# Altium footprint library CustomCase.PcbLib: 268 footprints (part 2 of 17)
Each footprint in its own frame and in the unit in brackets; x right, y up, seen from the top. Pads: shape width x height; smd on the part's side, far side on the other; paste and mask are expansions set on the pad; w line width, h text height; cw(c..) or ccw(c..) is an arc to the next point about the centre after c.
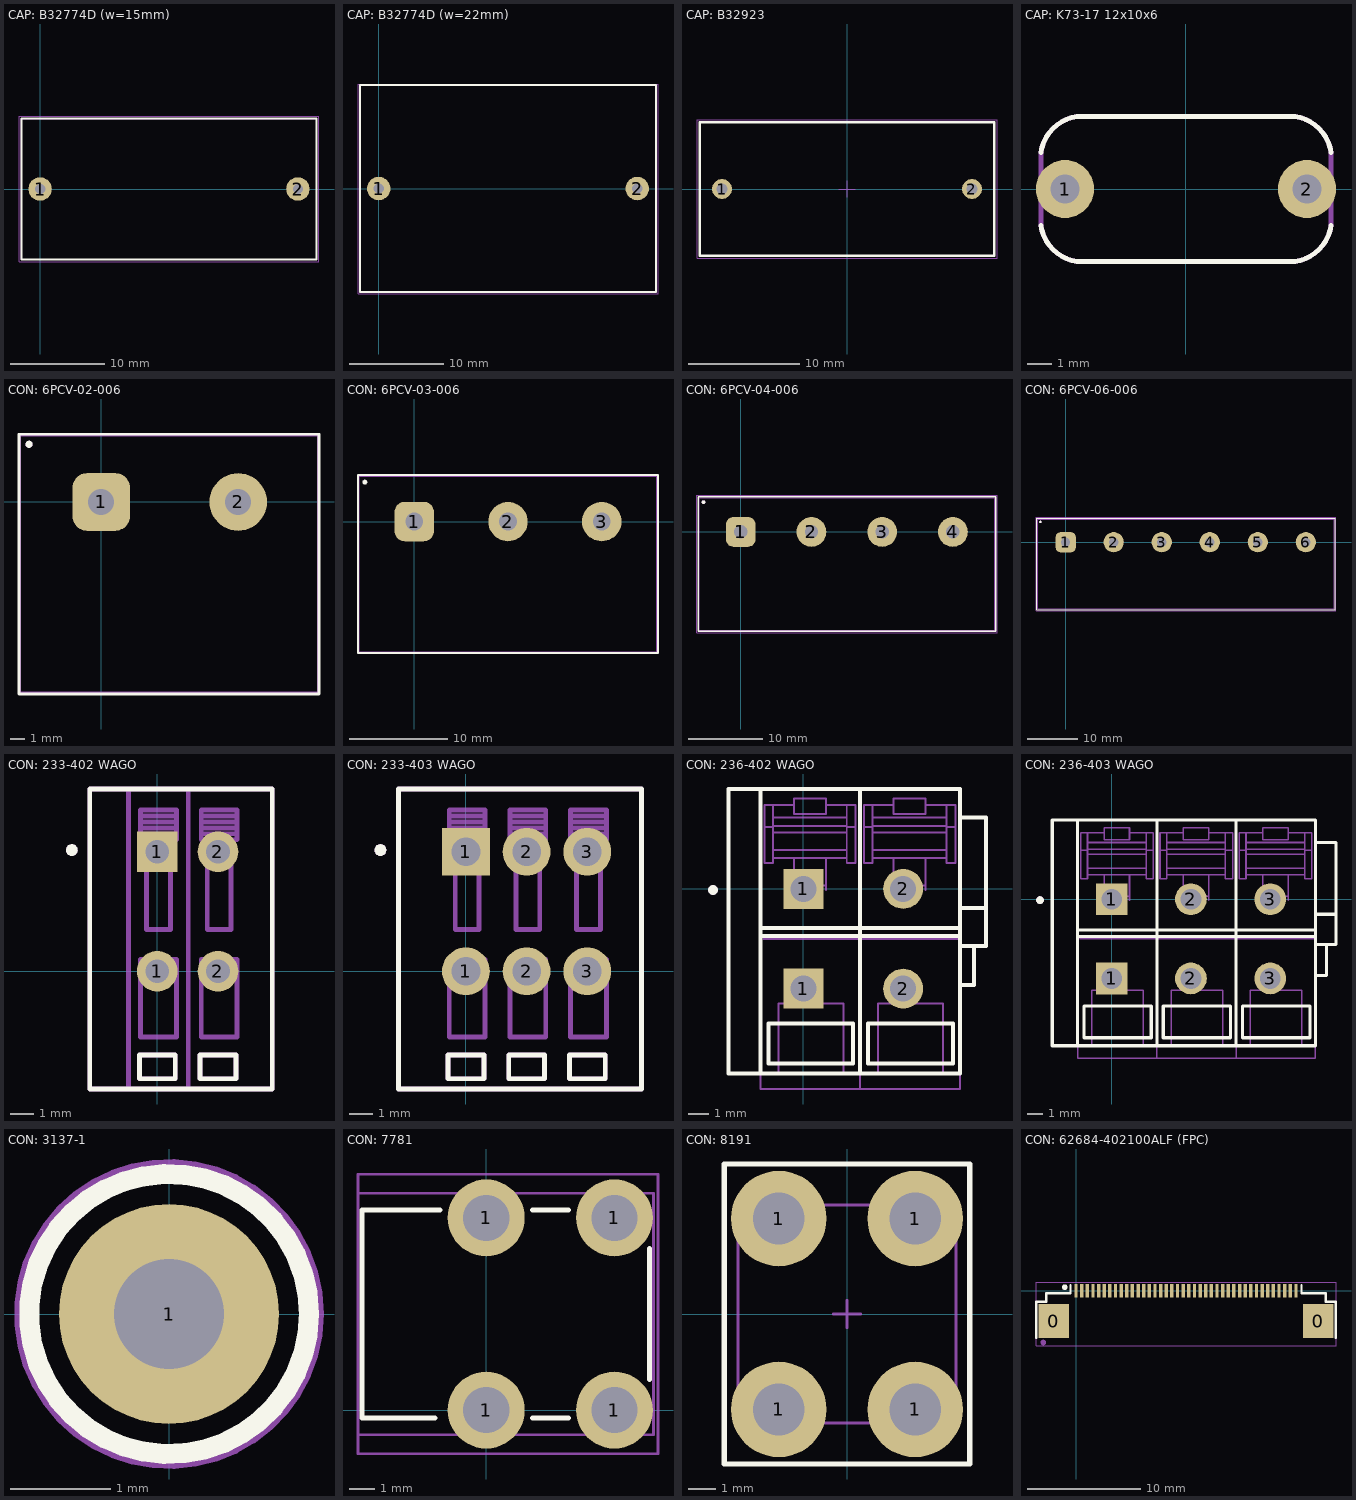
[diagram p1: the footprints below, top view; thin cyan lines are the x and y axes]

## CAP: B32774D (w=15mm) [mm]
pads (2):
  round 2.5 hole 1.1: 1(0,0) 2(27.5,0)
Top Overlay:
  lines w0.2: -2,-7.5 29.5,-7.5 29.5,7.5 -2,7.5 -2,-7.5
Top Assy:
  lines w0.1: -2,-7.5 29.5,-7.5 29.5,7.5 -2,7.5 -2,-7.5
Size Area:
  lines w0.1: -2.25,-7.75 29.75,-7.75 29.75,7.75 -2.25,7.75 -2.25,-7.75
3D body "2.STEP": height 24.55, standoff -2.95, extent -2,-7.5 29.5,7.5

## CAP: B32774D (w=22mm) [mm]
pads (2):
  round 2.5 hole 1.1: 1(0,0) 2(27.5,0)
Top Overlay:
  lines w0.2: -2,-11 29.5,-11 29.5,11 -2,11 -2,-11
Top Assy:
  lines w0.1: -2,-11 -2,11 29.5,11 29.5,-11 -2,-11
Size Area:
  lines w0.1: -2.2,-11.2 29.7,-11.2 29.7,11.1 -2.2,11.1 -2.2,-11.2
3D body "B32774D (w=22mm).STEP": height 36.5, standoff -3, extent -2,-11 29.5,11

## CAP: B32923 [mm]
pads (2):
  round 1.8 hole 1: 1(-11.25,0) 2(11.25,0)
Top Overlay:
  lines w0.2: -13.25,-6 -13.25,6 13.25,6 13.25,-6 -13.25,-6
Top Assy:
  lines w0.1: -13.25,-6 13.25,-6 13.25,6 -13.25,6 -13.25,-6
Size Area:
  lines w0.1: -0.75,0 0.75,0 ; 0,-0.75 0,0.75 ; -13.5,-6.25 -13.5,6.25 13.5,6.25 13.5,-6.25 -13.5,-6.25
3D body "B32923.STEP": height 22, standoff -3, extent -13.25,-6 13.25,6

## CAP: K73-17 12x10x6 [mm] "63V, 0.22uF"
height 10
pads (2):
  round 2.4 hole 1.2: 1(-5,0) 2(5,0)
Top Overlay:
  lines w0.2: -6,-1.5 ccw(c-4.25,-1.25) -4.5,-3 4.5,-3 ccw(c4.25,-1.25) 6,-1.5 ; -6,1.5 cw(c-4.25,1.25) -4.5,3 4.5,3 cw(c4.25,1.25) 6,1.5
Top Assy:
  lines w0.2: -6,-1.5 ccw(c-4.25,-1.25) -4.5,-3 4.5,-3 ccw(c4.25,-1.25) 6,-1.5 6,1.5 ccw(c4.25,1.25) 4.5,3 -4.5,3 ccw(c-4.25,1.25) -6,1.5 -6,-1.5
Size Area:
  lines w0.2: -6,-1.5 ccw(c-4.25,-1.25) -4.5,-3 4.5,-3 ccw(c4.25,-1.25) 6,-1.5 6,1.5 ccw(c4.25,1.25) 4.5,3 -4.5,3 ccw(c-4.25,1.25) -6,1.5 -6,-1.5
3D body "CAPRR1000W60L1300T500H1100.STEP": height 10.7, standoff -2.75, extent -6.5,-2.5 6.5,2.5

## CON: 6PCV-02-006 [mm]
pads (4):
  rrect50% 4x4 hole 1.8: 1(0,0)
  round 4 hole 1.8: 2(9.5,0)
  round 0.5 on Mech1: ""(-5,4)
  round 0.5 on Top Overlay: ""(-5,4)
Top Overlay:
  lines w0.2: -5.7,-13.3 -5.7,4.7 15.1,4.7 15.1,-13.3 -5.7,-13.3
Top Assy:
  lines w0.1: -5.6,-13.2 -5.6,4.58 15,4.58 15,-13.2 -5.6,-13.2
  text "2" at 9.2,-3.6 h2
  text "1" at -0.2,-3.6 h2
Size Area:
  lines w0.1: -5.7,-13.3 15.1,-13.3 15.1,4.7 -5.7,4.7 -5.7,-13.3
3D body "02.STEP": height 15.96, standoff -4.99, extent -5.6,-13.2 15,4.58

## CON: 6PCV-03-006 [mm]
pads (4):
  rrect50% 4x4 hole 1.8: 1(0,0)
  round 4 hole 1.8: 2(9.5,0) 3(19,0)
  round 0.5 on Top Overlay: ""(-5,4)
Top Overlay:
  lines w0.2: -5.7,-13.3 -5.7,4.7 24.7,4.7 24.7,-13.3 -5.7,-13.3
Top Assy:
  lines w0.1: -5.562,-13.2 -5.562,4.58 24.562,4.58 24.562,-13.2 -5.562,-13.2
  text "1" at -0.2,-3.6 h2
  text "2" at 9.2,-3.6 h2
  text "3" at 18.8,-3.6 h2
Size Area:
  lines w0.1: -5.675,-13.3 -5.675,4.675 24.675,4.675 24.675,-13.3 -5.675,-13.3
3D body "03.STEP": height 15.96, standoff -4.99, extent -5.562,-13.2 24.562,4.58

## CON: 6PCV-04-006 [mm]
pads (6):
  rrect50% 4x4 hole 1.8: 1(0,0)
  round 4 hole 1.8: 2(9.5,0) 3(19,0) 4(28.5,0)
  round 0.5 on Mech1: ""(-5,4)
  round 0.5 on Top Overlay: ""(-5,4)
Top Overlay:
  lines w0.2: -5.7,-13.35 -5.7,4.725 34.25,4.725 34.25,-13.35 -5.7,-13.35
Top Assy:
  lines w0.1: -5.55,-13.2 -5.55,4.58 34.1,4.58 34.1,-13.2 -5.55,-13.2
  text "1" at -0.2,-3.6 h2
  text "2" at 9.2,-3.6 h2
  text "3" at 18.8,-3.6 h2
  text "4" at 28.2,-3.6 h2
Size Area:
  lines w0.1: -5.875,-13.525 -5.875,4.9 34.425,4.9 34.425,-13.525 -5.875,-13.525
3D body "6pcv-04-006.STEP": height 15.96, standoff -4.99, extent -5.525,-13.18 34.125,4.6

## CON: 6PCV-06-006 [mm]
pads (8):
  rrect50% 4x4 hole 1.8: 1(0,0)
  round 4 hole 1.8: 2(9.5,0) 3(19,0) 4(28.5,0) 5(38,0) 6(47.5,0)
  round 0.5 on Mech1: ""(-5,4)
  round 0.5 on Top Overlay: ""(-5,4)
Top Overlay:
  lines w0.2: -5.7,-13.35 53.3,-13.35 53.3,4.725 -5.7,4.725 -5.7,-13.35
Top Assy:
  lines w0.1: -5.55,-13.2 53.15,-13.2 53.15,4.58 -5.55,4.58 -5.55,-13.2
  text "6" at 47.2,-3.5 h2
  text "5" at 37.7,-3.6 h2
  text "4" at 28.2,-3.6 h2
  text "3" at 18.8,-3.6 h2
  text "2" at 9.2,-3.6 h2
  text "1" at -0.2,-3.6 h2
Size Area:
  lines w0.1: -5.875,-13.525 53.475,-13.525 53.475,4.9 -5.875,4.9 -5.875,-13.525
3D body "6pcv-06-006.STEP": height 15.96, standoff -4.99, extent -5.55,-13.2 53.15,4.58

## CON: 233-402 WAGO [mm] "pcb terminal strip"
height 11.7
pads (6):
  round 1.7 hole 1: 1(0,0) 2(2.54,0) 2(2.54,5)
  rect 1.7x1.7 hole 1: 1(0,5)
  round 0.5 on Top Overlay: ""(-3.577,5.073)
  round 0.5 on Mech1: ""(-3.577,5.073)
Top Overlay:
  lines w0.2: -2.827,-4.927 -2.827,7.627 4.807,7.627 4.807,-4.927 -2.827,-4.927 ; -0.75,-4.5 -0.75,-3.5 0.75,-3.5 0.75,-4.5 -0.75,-4.5 ; 1.79,-4.5 1.79,-3.5 3.29,-3.5 3.29,-4.5 1.79,-4.5
Top Assy:
  lines w0.2: -1.2,-4.8 -1.2,7.5 ; -0.7,6.25 0.8,6.25 ; -0.7,6.5 0.8,6.5 ; 0.8,5.75 -0.7,5.75 -0.7,6 ; 1.3,-4.8 1.3,7.5 ; 1.84,6.25 3.34,6.25 ; 1.84,6.5 3.34,6.5 ; 3.34,5.75 1.84,5.75 1.84,6 ; -0.7,5.5 0.8,5.5 ; -0.7,5.5 -0.7,6.75 0.8,6.75 0.8,5.5 ; -0.7,5.5 -0.7,6 ; -0.7,5.5 -0.45,5.5 -0.45,1.75 0.55,1.75 0.55,5.5 0.8,5.5 ; -0.7,6 0.8,6 0.8,5.5 ; 1.84,5.5 2.09,5.5 2.09,1.75 3.09,1.75 3.09,5.5 3.34,5.5 ; 1.84,5.5 1.84,6 ; 1.84,5.5 1.84,6.75 3.34,6.75 3.34,5.5 ; 1.84,5.5 3.34,5.5 ; 1.84,6 3.34,6 3.34,5.5 ; -2.827,-4.927 -2.827,7.627 4.807,7.627 4.807,-4.927 -2.827,-4.927 ; -0.75,-4.5 -0.75,-3.5 0.75,-3.5 0.75,-4.5 -0.75,-4.5 ; -0.7,-2.75 -0.7,0.5 0.8,0.5 0.8,-2.75 -0.7,-2.75 ; 1.79,-4.5 1.79,-3.5 3.29,-3.5 3.29,-4.5 1.79,-4.5 ; 1.84,-2.75 3.34,-2.75 3.34,0.5 1.84,0.5 1.84,-2.75
  text "1" at -1.7,4.95 h0.94
3D body "233-402.stp": height 11.73, standoff -4, extent -2.7,-4.8 4.68,7.524

## CON: 233-403 WAGO [mm] "pcb terminal strip"
height 11.7
pads (8):
  round 2 hole 1.2: 1(0,0) 2(2.54,0) 2(2.54,5) 3(5.08,0) 3(5.08,5)
  rect 2x2 hole 1.2: 1(0,5)
  round 0.5 on Top Overlay: ""(-3.577,5.073)
  round 0.5 on Mech1: ""(-3.577,5.073)
Top Overlay:
  lines w0.2: -2.827,-4.927 7.347,-4.927 7.347,7.627 -2.827,7.627 -2.827,-4.927 ; -0.75,-4.5 0.75,-4.5 0.75,-3.5 -0.75,-3.5 -0.75,-4.5 ; 1.79,-4.5 3.29,-4.5 3.29,-3.5 1.79,-3.5 1.79,-4.5 ; 4.33,-4.5 4.33,-3.5 5.83,-3.5 5.83,-4.5 4.33,-4.5
Top Assy:
  lines w0.2: -0.7,6.25 0.8,6.25 ; -0.7,6.5 0.8,6.5 ; 0.8,5.75 -0.7,5.75 -0.7,6 ; 1.84,6.25 3.34,6.25 ; 1.84,6.5 3.34,6.5 ; 3.34,5.75 1.84,5.75 1.84,6 ; 4.38,6.25 5.88,6.25 ; 4.38,6.5 5.88,6.5 ; 5.88,5.75 4.38,5.75 4.38,6 ; -0.7,5.5 -0.45,5.5 -0.45,1.75 0.55,1.75 0.55,5.5 0.8,5.5 ; -0.7,5.5 -0.7,6 ; -0.7,5.5 -0.7,6.75 0.8,6.75 0.8,5.5 ; -0.7,5.5 0.8,5.5 ; -0.7,6 0.8,6 0.8,5.5 ; 1.84,5.5 3.34,5.5 ; 1.84,5.5 1.84,6.75 3.34,6.75 3.34,5.5 ; 1.84,5.5 1.84,6 ; 1.84,5.5 2.09,5.5 2.09,1.75 3.09,1.75 3.09,5.5 3.34,5.5 ; 1.84,6 3.34,6 3.34,5.5 ; 4.38,5.5 4.63,5.5 4.63,1.75 5.63,1.75 5.63,5.5 5.88,5.5 ; 4.38,5.5 4.38,6 ; 4.38,5.5 4.38,6.75 5.88,6.75 5.88,5.5 ; 4.38,5.5 5.88,5.5 ; 4.38,6 5.88,6 5.88,5.5 ; -2.827,-4.927 7.347,-4.927 7.347,7.627 -2.827,7.627 -2.827,-4.927 ; -0.75,-4.5 0.75,-4.5 0.75,-3.5 -0.75,-3.5 -0.75,-4.5 ; -0.7,-2.75 0.8,-2.75 0.8,0.5 -0.7,0.5 -0.7,-2.75 ; 1.79,-4.5 3.29,-4.5 3.29,-3.5 1.79,-3.5 1.79,-4.5 ; 1.84,-2.75 1.84,0.5 3.34,0.5 3.34,-2.75 1.84,-2.75 ; 4.33,-4.5 4.33,-3.5 5.83,-3.5 5.83,-4.5 4.33,-4.5 ; 4.38,-2.75 5.88,-2.75 5.88,0.5 4.38,0.5 4.38,-2.75
  text "1" at -1.7,4.95 h0.94
3D body "233-403.stp": height 11.73, standoff -4, extent -2.827,-4.927 7.093,7.397

## CON: 236-402 WAGO [mm] "pcb terminal strip"
height 13
pads (6):
  rect 2x2 hole 1.3 mask+0.075: 1(0,-5) 1(0,0)
  round 2 hole 1.3 mask+0.075: 2(5,-5) 2(5,0)
  round 0.5 on Top Overlay: ""(-4.525,-0.059)
  round 0.5 on Mech1: ""(-4.525,-0.059)
Top Overlay:
  lines w0.2: -3.75,-6.818 -3.75,5 -2.15,5 ; -3.75,-6.641 -3.75,-9.25 -2.15,-9.25 ; -2.15,-2.362 2.85,-2.362 7.85,-2.362 ; -2.15,-1.953 2.85,-1.953 7.85,-1.953 ; -2.15,0.7 -2.15,5 ; -2.15,0.948 -2.15,-9.25 ; 2.85,-9.243 2.85,-4.81 ; 2.85,-3.804 2.85,-4.81 ; 2.85,5 2.85,-4.81 ; 7.85,-9.245 -2.15,-9.25 ; 7.85,-9.243 7.85,5.004 ; 7.85,-2.856 9.15,-2.856 9.15,3.578 7.85,3.578 ; 7.85,-0.947 9.15,-0.947 ; 8.55,-2.856 8.55,-4.81 7.85,-4.81 7.85,5 -2.15,5 ; 7.85,-1.953 7.85,-1.953 ; -1.75,-8.743 -1.75,-6.743 2.5,-6.743 2.5,-8.743 -1.75,-8.743 ; 3.25,-8.743 3.25,-6.743 7.5,-6.743 7.5,-8.743 3.25,-8.743
Top Assy:
  lines w0.1: -2,-2.5 7.85,-2.5 ; -1.95,3.1 -1.525,3.1 ; -1.525,1.552 2.175,1.552 ; -1.525,1.941 2.175,1.941 ; -1.525,2.828 2.175,2.828 ; -1.525,3.16 2.175,3.16 ; -1.525,3.578 2.175,3.578 ; -1.525,4.199 -1.525,1.298 -1.95,1.298 -1.95,4.199 -0.475,4.199 ; -0.475,-0.059 -0.475,1.552 ; -0.475,0.177 1.125,0.177 ; 1.125,-0.059 1.125,1.552 ; 1.125,4.199 2.625,4.199 2.625,1.298 2.175,1.298 2.175,4.199 ; 2.175,3.1 2.625,3.1 ; 2.85,-10 2.85,0.9 2.85,4.95 ; 3.05,3.1 3.475,3.1 ; 3.475,1.552 7.175,1.552 ; 3.475,1.941 7.175,1.941 ; 3.475,2.828 7.175,2.828 ; 3.475,3.16 7.175,3.16 ; 3.475,3.578 7.175,3.578 ; 3.475,4.199 3.475,1.298 3.05,1.298 3.05,4.199 4.525,4.199 ; 4.525,-0.059 4.525,1.552 ; 4.525,0.177 6.125,0.177 ; 6.125,-0.059 6.125,1.552 ; 6.125,4.199 7.625,4.199 7.625,1.298 7.175,1.298 7.175,4.199 ; 7.175,3.1 7.625,3.1 ; -2.15,-10.025 -2.15,0.9 -2.15,5 7.85,5 7.85,0.95 7.85,-10.025 -2.15,-10.025 ; -1.25,-9.25 -1.25,-5.75 2,-5.75 2,-9.25 -1.25,-9.25 ; -0.475,3.75 1.125,3.75 1.125,4.519 -0.475,4.519 -0.475,3.75 ; 3.75,-9.25 7,-9.25 7,-5.75 3.75,-5.75 3.75,-9.25 ; 4.525,3.75 4.525,4.519 6.125,4.519 6.125,3.75 4.525,3.75
Mechanical 8:
  lines w0.1: -0.5,-5 0,-5 ; -0.5,0 0,0 ; -0.125,0 0.375,0 ; 0,-5.5 0,-5 ; 0,-4.5 0,-5 ; 0,0.5 0,0 ; 0.375,-0.5 0.375,0 ; 0.375,0.5 0.375,0 ; 0.5,-5 0,-5 ; 0.5,0 0,0 ; 0.875,0 0.375,0 ; 4.5,-5 5,-5 ; 4.5,0 5,0 ; 4.875,0 5.375,0 ; 5,-5.5 5,-5 ; 5,-4.5 5,-5 ; 5,-0.5 5,0 ; 5,0.5 5,0 ; 5.375,-0.5 5.375,0 ; 5.375,0.5 5.375,0 ; 5.5,-5 5,-5 ; 5.5,0 5,0 ; 5.875,0 5.375,0 ; 0,-0.5 0,0 ; 0,-0.5 0,0 ; 0,-0.5 0,0
3D body "236-401.stp": height 12.71, standoff -5.5, extent 1.5,-9.036 8.8,5.05
3D body "236-401.stp": height 12.71, standoff -5.5, extent -3.5,-9.036 3.8,5.05

## CON: 236-403 WAGO [mm] "pcb terminal strip"
height 13
pads (8):
  rect 2x2 hole 1.3 mask+0.075: 1(0,-5) 1(0,0)
  round 2 hole 1.3 mask+0.075: 2(5,-5) 2(5,0) 3(10,-5) 3(10,0)
  round 0.5 on Top Overlay: ""(-4.525,-0.059)
  round 0.5 on Mech1: ""(-4.525,-0.059)
Top Overlay:
  lines w0.2: -3.75,-6.818 -3.75,5 -2.15,5 ; -3.75,-6.641 -3.75,-9.25 -2.15,-9.25 ; -2.15,-2.362 2.85,-2.362 12.85,-2.362 ; -2.15,-1.953 2.85,-1.953 7.85,-1.953 12.85,-1.953 ; -2.15,0.7 -2.15,5 ; -2.15,0.948 -2.15,-9.25 ; 2.85,-9.243 2.85,-4.81 ; 2.85,-3.804 2.85,-4.81 ; 2.85,5 2.85,-4.81 ; 7.85,-9.243 7.85,5.004 ; 12.85,-2.856 14.15,-2.856 14.15,3.578 12.85,3.578 ; 12.85,-0.947 14.15,-0.947 ; 13.55,-2.856 13.55,-4.81 12.85,-4.81 ; -2.15,-9.25 12.85,-9.243 12.85,-4.81 ; -2.15,5 12.85,5 12.85,-4.81 ; -1.75,-8.743 2.5,-8.743 2.5,-6.743 -1.75,-6.743 -1.75,-8.743 ; 3.25,-8.743 7.5,-8.743 7.5,-6.743 3.25,-6.743 3.25,-8.743 ; 8.25,-8.743 12.5,-8.743 12.5,-6.743 8.25,-6.743 8.25,-8.743
Top Assy:
  lines w0.1: -2,-2.5 12.85,-2.5 ; -1.95,3.1 -1.525,3.1 ; -1.525,1.552 2.175,1.552 ; -1.525,1.941 2.175,1.941 ; -1.525,2.828 2.175,2.828 ; -1.525,3.16 2.175,3.16 ; -1.525,3.578 2.175,3.578 ; -1.525,4.199 -1.525,1.298 -1.95,1.298 -1.95,4.199 -0.475,4.199 ; -0.475,-0.059 -0.475,1.552 ; -0.475,0.177 1.125,0.177 ; 1.125,-0.059 1.125,1.552 ; 1.125,4.199 2.625,4.199 2.625,1.298 2.175,1.298 2.175,4.199 ; 2.175,3.1 2.625,3.1 ; 2.85,-10 2.85,0.9 2.85,4.95 ; 3.05,3.1 3.475,3.1 ; 3.475,1.552 7.175,1.552 ; 3.475,1.941 7.175,1.941 ; 3.475,2.828 7.175,2.828 ; 3.475,3.16 7.175,3.16 ; 3.475,3.578 7.175,3.578 ; 3.475,4.199 3.475,1.298 3.05,1.298 3.05,4.199 4.525,4.199 ; 4.525,-0.059 4.525,1.552 ; 4.525,0.177 6.125,0.177 ; 6.125,-0.059 6.125,1.552 ; 6.125,4.199 7.625,4.199 7.625,1.298 7.175,1.298 7.175,4.199 ; 7.175,3.1 7.625,3.1 ; 7.85,-10.025 7.85,0.95 7.85,5 ; 8.05,3.1 8.475,3.1 ; 8.475,1.552 12.175,1.552 ; 8.475,1.941 12.175,1.941 ; 8.475,2.828 12.175,2.828 ; 8.475,3.16 12.175,3.16 ; 8.475,3.578 12.175,3.578 ; 8.475,4.199 8.475,1.298 8.05,1.298 8.05,4.199 9.525,4.199 ; 9.525,-0.059 9.525,1.552 ; 9.525,0.177 11.125,0.177 ; 11.125,-0.059 11.125,1.552 ; 11.125,4.199 12.625,4.199 12.625,1.298 12.175,1.298 12.175,4.199 ; 12.175,3.1 12.625,3.1 ; 12.85,-10.025 -2.15,-10.025 -2.15,0.9 -2.15,5 12.85,5 ; 12.85,-10 12.85,0.95 12.85,4.95 ; -1.25,-9.25 2,-9.25 2,-5.75 -1.25,-5.75 -1.25,-9.25 ; -0.475,3.75 -0.475,4.519 1.125,4.519 1.125,3.75 -0.475,3.75 ; 3.75,-9.25 3.75,-5.75 7,-5.75 7,-9.25 3.75,-9.25 ; 4.525,3.75 6.125,3.75 6.125,4.519 4.525,4.519 4.525,3.75 ; 8.75,-9.25 8.75,-5.75 12,-5.75 12,-9.25 8.75,-9.25 ; 9.525,3.75 11.125,3.75 11.125,4.519 9.525,4.519 9.525,3.75
Mechanical 8:
  lines w0.1: -0.5,-5 0,-5 ; -0.5,0 0,0 ; -0.125,0 0.375,0 ; 0,-5.5 0,-5 ; 0,-4.5 0,-5 ; 0,0.5 0,0 ; 0.375,-0.5 0.375,0 ; 0.375,0.5 0.375,0 ; 0.5,-5 0,-5 ; 0.5,0 0,0 ; 0.875,0 0.375,0 ; 4.5,-5 5,-5 ; 4.5,0 5,0 ; 4.875,0 5.375,0 ; 5,-5.5 5,-5 ; 5,-4.5 5,-5 ; 5,-0.5 5,0 ; 5,0.5 5,0 ; 5.375,-0.5 5.375,0 ; 5.375,0.5 5.375,0 ; 5.5,-5 5,-5 ; 5.5,0 5,0 ; 5.875,0 5.375,0 ; 9.5,-5 10,-5 ; 9.875,0 10.375,0 ; 10,-5.5 10,-5 ; 10,-4.5 10,-5 ; 10.375,-0.5 10.375,0 ; 10.375,0.5 10.375,0 ; 10.5,-5 10,-5 ; 10.875,0 10.375,0 ; 0,-0.5 0,0 ; 0,-0.5 0,0 ; 0,-0.5 0,0 ; 10,0 10.5,0 10,0 ; 10,0 10,-0.5 10,0 ; 10,0 9.5,0 10,0 ; 10,0 10,0.5 10,0
3D body "236-401.stp": height 12.71, standoff -5.5, extent -3.5,-9.036 3.8,5.05
3D body "236-401.stp": height 12.71, standoff -5.5, extent 1.5,-9.036 8.8,5.05
3D body "236-401.stp": height 12.71, standoff -5.5, extent 6.5,-9.036 13.8,5.05

## CON: 3137-1 [mm]
pads (1):
  round 2.2 hole 1.1: 1(0,0)
Top Overlay:
  circle w0.2: c0,0 r1.4
Top Assy:
  circle w0.1: c0,0 r1.4
Size Area:
  circle w0.1: c0,0 r1.5
3D body "mill-max-3137-1-00-15-00-00-08-0.STEP": height 1.1, standoff -6.57, extent -0.775,-0.775 0.8,0.8

## CON: 7781 [mm]
pads (4):
  round 3 hole 1.8: 1(0,0) 1(0,7.5) 1(5,0) 1(5,7.5)
Top Overlay:
  lines w0.2: -2,-0.3 -4.85,-0.3 -4.85,7.8 -1.8,7.8 ; 1.8,-0.3 3.2,-0.3 ; 1.8,7.8 3.2,7.8 ; 6.375,1.2 6.375,6.3
Top Assy:
  lines w0.1: -5,-0.957 -5,8.457 6.523,8.457 6.523,-0.957 -5,-0.957
Size Area:
  lines w0.1: -5,-1.7 6.7,-1.7 6.7,9.2 -5,9.2 -5,-1.7
3D body "keystone-PN7781.STEP": height 8.01, standoff -4.99, extent -5,-0.957 6.523,8.457

## CON: 8191 [mm]
pads (4):
  round 3.5 hole 1.9: 1(-2.5,-3.5) 1(-2.5,3.5) 1(2.5,-3.5) 1(2.5,3.5)
Top Overlay:
  lines w0.2: -4.5,-5.5 -4.5,-2.5 -4.5,5.5 4.5,5.5 4.5,-5.5 -4.5,-5.5
Top Assy:
  lines w0.1: -4,-4 -4,4 4,4 4,-4 -4,-4
Size Area:
  lines w0.1: -0.5,0 0.5,0 ; 0,-0.5 0,0.5 ; -4.5,-5.5 -4.5,5.5 4.5,5.5 4.5,-5.5 -4.5,-5.5
3D body "User Library-Terminal 10A Keystone 8191.STEP": height 7.05, standoff -4.45, extent -4,-4 4,4

## CON: 62684-402100ALF (FPC) [mm]
pads (44):
  rect 2.7x3 smd: 0(-1.975,-2.7) 0(21.475,-2.7)
  rect 0.3x1.2 smd: 1(0,0) 2(0.5,0) 3(1,0) 4(1.5,0) 5(2,0) 6(2.5,0) 7(3,0) 8(3.5,0) 9(4,0) 10(4.5,0) 11(5,0) 12(5.5,0) 13(6,0) 14(6.5,0) 15(7,0) 16(7.5,0) 17(8,0) 18(8.5,0) 19(9,0) 20(9.5,0) 21(10,0) 22(10.5,0) 23(11,0) 24(11.5,0) 25(12,0) 26(12.5,0) 27(13,0) 28(13.5,0) 29(14,0) 30(14.5,0) 31(15,0) 32(15.5,0) 33(16,0) 34(16.5,0) 35(17,0) 36(17.5,0) 37(18,0) 38(18.5,0) 39(19,0) 40(19.5,0)
  round 0.5 on Mech1: ""(-2.9,-4.6)
  round 0.5 on Top Overlay: ""(-1,0.3)
Top Overlay:
  lines w0.2: -3.525,-4.2 -3.525,-1 -2.65,-1 -2.65,-0.225 -0.5,-0.225 -0.5,0.5 ; 20,0.5 20,-0.225 22.15,-0.225 22.15,-1 23.025,-1 23.025,-4.2
Size Area:
  lines w0.1: -3.55,-4.9 -3.55,0.75 23.05,0.75 23.05,-4.9 -3.55,-4.9
3D body "62684-402100ALF.SLDPRT": height 2.05, standoff 0, extent -3,-5.4 22.5,0.2